# Altium footprint library Connector_Samtec_HLE_SMD.PcbLib: 290 footprints (part 21 of 24) (continued)
## Samtec_HLE-147-02-xxx-DV-BE-A_2x47_P2.54mm_Horizontal [mm] (continued)
  round 1.78 hole 1.78: Un37(-57.15,0) Un61(57.15,0)
F.SilkS:
  lines w0.12: -59.315,-2.65 -59.8,-2.65 -59.8,2.65 -59.315,2.65 -59.315,3.56 ; -57.525,-2.65 -56.775,-2.65 ; -57.525,2.65 -56.775,2.65 ; -54.985,-2.65 -54.235,-2.65 ; -54.985,2.65 -54.235,2.65 ; -52.445,-2.65 -51.695,-2.65 ; -52.445,2.65 -51.695,2.65 ; -49.905,-2.65 -49.155,-2.65 ; -49.905,2.65 -49.155,2.65 ; -47.365,-2.65 -46.615,-2.65 ; -47.365,2.65 -46.615,2.65 ; -44.825,-2.65 -44.075,-2.65 ; -44.825,2.65 -44.075,2.65 ; -42.285,-2.65 -41.535,-2.65 ; -42.285,2.65 -41.535,2.65 ; -39.745,-2.65 -38.995,-2.65 ; -39.745,2.65 -38.995,2.65 ; -37.205,-2.65 -36.455,-2.65 ; -37.205,2.65 -36.455,2.65 ; -34.665,-2.65 -33.915,-2.65 ; -34.665,2.65 -33.915,2.65 ; -32.125,-2.65 -31.375,-2.65 ; -32.125,2.65 -31.375,2.65 ; -29.585,-2.65 -28.835,-2.65 ; -29.585,2.65 -28.835,2.65 ; -27.045,-2.65 -26.295,-2.65 ; -27.045,2.65 -26.295,2.65 ; -24.505,-2.65 -23.755,-2.65 ; -24.505,2.65 -23.755,2.65 ; -21.965,-2.65 -21.215,-2.65 ; -21.965,2.65 -21.215,2.65 ; -19.425,-2.65 -18.675,-2.65 ; -19.425,2.65 -18.675,2.65 ; -16.885,-2.65 -16.135,-2.65 ; -16.885,2.65 -16.135,2.65 ; -14.345,-2.65 -13.595,-2.65 ; -14.345,2.65 -13.595,2.65 ; -11.805,-2.65 -11.055,-2.65 ; -11.805,2.65 -11.055,2.65 ; -9.265,-2.65 -8.515,-2.65 ; -9.265,2.65 -8.515,2.65 ; -6.725,-2.65 -5.975,-2.65 ; -6.725,2.65 -5.975,2.65 ; -4.185,-2.65 -3.435,-2.65 ; -4.185,2.65 -3.435,2.65 ; -1.645,-2.65 -0.895,-2.65 ; -1.645,2.65 -0.895,2.65 ; 0.895,-2.65 1.645,-2.65 ; 0.895,2.65 1.645,2.65 ; 3.435,-2.65 4.185,-2.65 ; 3.435,2.65 4.185,2.65 ; 5.975,-2.65 6.725,-2.65 ; 5.975,2.65 6.725,2.65 ; 8.515,-2.65 9.265,-2.65 ; 8.515,2.65 9.265,2.65 ; 11.055,-2.65 11.805,-2.65 ; 11.055,2.65 11.805,2.65 ; 13.595,-2.65 14.345,-2.65 ; 13.595,2.65 14.345,2.65 ; 16.135,-2.65 16.885,-2.65 ; 16.135,2.65 16.885,2.65 ; 18.675,-2.65 19.425,-2.65 ; 18.675,2.65 19.425,2.65 ; 21.215,-2.65 21.965,-2.65 ; 21.215,2.65 21.965,2.65 ; 23.755,-2.65 24.505,-2.65 ; 23.755,2.65 24.505,2.65 ; 26.295,-2.65 27.045,-2.65 ; 26.295,2.65 27.045,2.65 ; 28.835,-2.65 29.585,-2.65 ; 28.835,2.65 29.585,2.65 ; 31.375,-2.65 32.125,-2.65 ; 31.375,2.65 32.125,2.65 ; 33.915,-2.65 34.665,-2.65 ; 33.915,2.65 34.665,2.65 ; 36.455,-2.65 37.205,-2.65 ; 36.455,2.65 37.205,2.65 ; 38.995,-2.65 39.745,-2.65 ; 38.995,2.65 39.745,2.65 ; 41.535,-2.65 42.285,-2.65 ; 41.535,2.65 42.285,2.65 ; 44.075,-2.65 44.825,-2.65 ; 44.075,2.65 44.825,2.65 ; 46.615,-2.65 47.365,-2.65 ; 46.615,2.65 47.365,2.65 ; 49.155,-2.65 49.905,-2.65 ; 49.155,2.65 49.905,2.65 ; 51.695,-2.65 52.445,-2.65 ; 51.695,2.65 52.445,2.65 ; 54.235,-2.65 54.985,-2.65 ; 54.235,2.65 54.985,2.65 ; 56.775,-2.65 57.525,-2.65 ; 56.775,2.65 57.525,2.65 ; 59.315,-2.65 59.8,-2.65 59.8,2.65 59.315,2.65
F.CrtYd:
  lines w0.05: -60.19,-4.06 60.19,-4.06 60.19,4.06 -60.19,4.06 -60.19,-4.06
F.Fab:
  lines w0.1: -58.92,2.54 -58.42,1.833 -57.92,2.54 ; -59.69,-2.54 -59.69,2.54 59.69,2.54 59.69,-2.54 -59.69,-2.54
  text "'.Designator'" at -4.047,-2.68 h1

## Samtec_HLE-147-02-xxx-DV-BE-LC_2x47_P2.54mm_Horizontal [mm]
pads (190):
  rect 1.27x1.68 smd: 1(-58.42,2.72) 2(-58.42,-2.72) 3(-55.88,2.72) 4(-55.88,-2.72) 5(-53.34,2.72) 6(-53.34,-2.72) 7(-50.8,2.72) 8(-50.8,-2.72) 9(-48.26,2.72) 10(-48.26,-2.72) 11(-45.72,2.72) 12(-45.72,-2.72) 13(-43.18,2.72) 14(-43.18,-2.72) 15(-40.64,2.72) 16(-40.64,-2.72) 17(-38.1,2.72) 18(-38.1,-2.72) 19(-35.56,2.72) 20(-35.56,-2.72) 21(-33.02,2.72) 22(-33.02,-2.72) 23(-30.48,2.72) 24(-30.48,-2.72) 25(-27.94,2.72) 26(-27.94,-2.72) 27(-25.4,2.72) 28(-25.4,-2.72) 29(-22.86,2.72) 30(-22.86,-2.72) 31(-20.32,2.72) 32(-20.32,-2.72) 33(-17.78,2.72) 34(-17.78,-2.72) 35(-15.24,2.72) 36(-15.24,-2.72) 37(-12.7,2.72) 38(-12.7,-2.72) 39(-10.16,2.72) 40(-10.16,-2.72) 41(-7.62,2.72) 42(-7.62,-2.72) 43(-5.08,2.72) 44(-5.08,-2.72) 45(-2.54,2.72) 46(-2.54,-2.72) 47(0,2.72) 48(0,-2.72) 49(2.54,2.72) 50(2.54,-2.72) 51(5.08,2.72) 52(5.08,-2.72) 53(7.62,2.72) 54(7.62,-2.72) 55(10.16,2.72) 56(10.16,-2.72) 57(12.7,2.72) 58(12.7,-2.72) 59(15.24,2.72) 60(15.24,-2.72) 61(17.78,2.72) 62(17.78,-2.72) 63(20.32,2.72) 64(20.32,-2.72) 65(22.86,2.72) 66(22.86,-2.72) 67(25.4,2.72) 68(25.4,-2.72) 69(27.94,2.72) 70(27.94,-2.72) 71(30.48,2.72) 72(30.48,-2.72) 73(33.02,2.72) 74(33.02,-2.72) 75(35.56,2.72) 76(35.56,-2.72) 77(38.1,2.72) 78(38.1,-2.72) 79(40.64,2.72) 80(40.64,-2.72) 81(43.18,2.72) 82(43.18,-2.72) 83(45.72,2.72) 84(45.72,-2.72) 85(48.26,2.72) 86(48.26,-2.72) 87(50.8,2.72) 88(50.8,-2.72) 89(53.34,2.72) 90(53.34,-2.72) 91(55.88,2.72) 92(55.88,-2.72) 93(58.42,2.72) 94(58.42,-2.72)
  round 0.97 hole 0.97: Un1(-45.72,1.27) Un2(5.08,-1.27) Un3(48.26,-1.27) Un4(-7.62,1.27) Un5(-40.64,-1.27) Un6(-10.16,1.27) Un7(-2.54,1.27) Un8(25.4,-1.27) Un9(-53.34,-1.27) Un10(-10.16,-1.27) Un11(-48.26,1.27) Un12(-20.32,1.27) Un13(-25.4,1.27) Un14(53.34,-1.27) Un15(12.7,1.27) Un16(-45.72,-1.27) Un17(30.48,-1.27) Un18(-15.24,-1.27) Un19(25.4,1.27) Un20(-58.42,1.27) Un21(-12.7,-1.27) Un22(58.42,1.27) Un23(20.32,-1.27) Un24(-12.7,1.27) Un25(-5.08,1.27) Un26(0,-1.27) Un27(-20.32,-1.27) Un28(38.1,-1.27) Un29(-35.56,1.27) Un30(17.78,1.27) Un31(10.16,-1.27) Un32(15.24,-1.27) Un33(-43.18,1.27) Un34(17.78,-1.27) Un35(-17.78,1.27) Un36(50.8,-1.27) Un37(15.24,1.27) Un38(-40.64,1.27) Un39(-27.94,-1.27) Un40(55.88,1.27) Un41(30.48,1.27) Un42(-50.8,1.27) Un43(-50.8,-1.27) Un44(35.56,-1.27) Un45(-25.4,-1.27) Un46(-38.1,-1.27) Un47(-17.78,-1.27) Un48(-30.48,-1.27) Un49(-33.02,1.27) Un50(53.34,1.27) Un51(58.42,-1.27) Un52(-48.26,-1.27) Un53(2.54,1.27) Un54(20.32,1.27) Un55(10.16,1.27) Un56(12.7,-1.27) Un57(-30.48,1.27) Un58(55.88,-1.27) Un59(-22.86,-1.27) Un60(33.02,-1.27) Un62(38.1,1.27) Un63(-2.54,-1.27) Un64(-5.08,-1.27) Un65(33.02,1.27) Un66(22.86,1.27) Un67(45.72,-1.27) Un68(-58.42,-1.27) Un69(-55.88,-1.27) Un70(-33.02,-1.27) Un71(-35.56,-1.27) Un72(-55.88,1.27) Un73(5.08,1.27) Un74(7.62,1.27) Un75(50.8,1.27) Un76(27.94,-1.27) Un77(22.86,-1.27) Un78(40.64,-1.27) Un79(-53.34,1.27) Un80(43.18,1.27) Un81(-38.1,1.27) Un82(27.94,1.27) Un83(-15.24,1.27) Un84(-7.62,-1.27) Un85(45.72,1.27) Un86(35.56,1.27) Un87(-43.18,-1.27) Un88(-27.94,1.27) Un89(0,1.27) Un90(40.64,1.27) Un91(2.54,-1.27) Un93(48.26,1.27) Un94(-22.86,1.27) Un95(43.18,-1.27) Un96(7.62,-1.27)
  round 1.19 hole 1.19: Un61(57.15,0) Un92(-57.15,0)
F.SilkS:
  lines w0.12: -59.315,-2.65 -59.8,-2.65 -59.8,2.65 -59.315,2.65 -59.315,3.56 ; -57.525,-2.65 -56.775,-2.65 ; -57.525,2.65 -56.775,2.65 ; -54.985,-2.65 -54.235,-2.65 ; -54.985,2.65 -54.235,2.65 ; -52.445,-2.65 -51.695,-2.65 ; -52.445,2.65 -51.695,2.65 ; -49.905,-2.65 -49.155,-2.65 ; -49.905,2.65 -49.155,2.65 ; -47.365,-2.65 -46.615,-2.65 ; -47.365,2.65 -46.615,2.65 ; -44.825,-2.65 -44.075,-2.65 ; -44.825,2.65 -44.075,2.65 ; -42.285,-2.65 -41.535,-2.65 ; -42.285,2.65 -41.535,2.65 ; -39.745,-2.65 -38.995,-2.65 ; -39.745,2.65 -38.995,2.65 ; -37.205,-2.65 -36.455,-2.65 ; -37.205,2.65 -36.455,2.65 ; -34.665,-2.65 -33.915,-2.65 ; -34.665,2.65 -33.915,2.65 ; -32.125,-2.65 -31.375,-2.65 ; -32.125,2.65 -31.375,2.65 ; -29.585,-2.65 -28.835,-2.65 ; -29.585,2.65 -28.835,2.65 ; -27.045,-2.65 -26.295,-2.65 ; -27.045,2.65 -26.295,2.65 ; -24.505,-2.65 -23.755,-2.65 ; -24.505,2.65 -23.755,2.65 ; -21.965,-2.65 -21.215,-2.65 ; -21.965,2.65 -21.215,2.65 ; -19.425,-2.65 -18.675,-2.65 ; -19.425,2.65 -18.675,2.65 ; -16.885,-2.65 -16.135,-2.65 ; -16.885,2.65 -16.135,2.65 ; -14.345,-2.65 -13.595,-2.65 ; -14.345,2.65 -13.595,2.65 ; -11.805,-2.65 -11.055,-2.65 ; -11.805,2.65 -11.055,2.65 ; -9.265,-2.65 -8.515,-2.65 ; -9.265,2.65 -8.515,2.65 ; -6.725,-2.65 -5.975,-2.65 ; -6.725,2.65 -5.975,2.65 ; -4.185,-2.65 -3.435,-2.65 ; -4.185,2.65 -3.435,2.65 ; -1.645,-2.65 -0.895,-2.65 ; -1.645,2.65 -0.895,2.65 ; 0.895,-2.65 1.645,-2.65 ; 0.895,2.65 1.645,2.65 ; 3.435,-2.65 4.185,-2.65 ; 3.435,2.65 4.185,2.65 ; 5.975,-2.65 6.725,-2.65 ; 5.975,2.65 6.725,2.65 ; 8.515,-2.65 9.265,-2.65 ; 8.515,2.65 9.265,2.65 ; 11.055,-2.65 11.805,-2.65 ; 11.055,2.65 11.805,2.65 ; 13.595,-2.65 14.345,-2.65 ; 13.595,2.65 14.345,2.65 ; 16.135,-2.65 16.885,-2.65 ; 16.135,2.65 16.885,2.65 ; 18.675,-2.65 19.425,-2.65 ; 18.675,2.65 19.425,2.65 ; 21.215,-2.65 21.965,-2.65 ; 21.215,2.65 21.965,2.65 ; 23.755,-2.65 24.505,-2.65 ; 23.755,2.65 24.505,2.65 ; 26.295,-2.65 27.045,-2.65 ; 26.295,2.65 27.045,2.65 ; 28.835,-2.65 29.585,-2.65 ; 28.835,2.65 29.585,2.65 ; 31.375,-2.65 32.125,-2.65 ; 31.375,2.65 32.125,2.65 ; 33.915,-2.65 34.665,-2.65 ; 33.915,2.65 34.665,2.65 ; 36.455,-2.65 37.205,-2.65 ; 36.455,2.65 37.205,2.65 ; 38.995,-2.65 39.745,-2.65 ; 38.995,2.65 39.745,2.65 ; 41.535,-2.65 42.285,-2.65 ; 41.535,2.65 42.285,2.65 ; 44.075,-2.65 44.825,-2.65 ; 44.075,2.65 44.825,2.65 ; 46.615,-2.65 47.365,-2.65 ; 46.615,2.65 47.365,2.65 ; 49.155,-2.65 49.905,-2.65 ; 49.155,2.65 49.905,2.65 ; 51.695,-2.65 52.445,-2.65 ; 51.695,2.65 52.445,2.65 ; 54.235,-2.65 54.985,-2.65 ; 54.235,2.65 54.985,2.65 ; 56.775,-2.65 57.525,-2.65 ; 56.775,2.65 57.525,2.65 ; 59.315,-2.65 59.8,-2.65 59.8,2.65 59.315,2.65
F.CrtYd:
  lines w0.05: -60.19,-4.06 60.19,-4.06 60.19,4.06 -60.19,4.06 -60.19,-4.06
F.Fab:
  lines w0.1: -58.92,2.54 -58.42,1.833 -57.92,2.54 ; -59.69,-2.54 59.69,-2.54 59.69,2.54 -59.69,2.54 -59.69,-2.54
  text "'.Designator'" at -4.047,-2.68 h1

## Samtec_HLE-147-02-xxx-DV-BE_2x47_P2.54mm_Horizontal [mm]
pads (188):
  rect 1.27x1.68 smd: 1(-58.42,2.72) 2(-58.42,-2.72) 3(-55.88,2.72) 4(-55.88,-2.72) 5(-53.34,2.72) 6(-53.34,-2.72) 7(-50.8,2.72) 8(-50.8,-2.72) 9(-48.26,2.72) 10(-48.26,-2.72) 11(-45.72,2.72) 12(-45.72,-2.72) 13(-43.18,2.72) 14(-43.18,-2.72) 15(-40.64,2.72) 16(-40.64,-2.72) 17(-38.1,2.72) 18(-38.1,-2.72) 19(-35.56,2.72) 20(-35.56,-2.72) 21(-33.02,2.72) 22(-33.02,-2.72) 23(-30.48,2.72) 24(-30.48,-2.72) 25(-27.94,2.72) 26(-27.94,-2.72) 27(-25.4,2.72) 28(-25.4,-2.72) 29(-22.86,2.72) 30(-22.86,-2.72) 31(-20.32,2.72) 32(-20.32,-2.72) 33(-17.78,2.72) 34(-17.78,-2.72) 35(-15.24,2.72) 36(-15.24,-2.72) 37(-12.7,2.72) 38(-12.7,-2.72) 39(-10.16,2.72) 40(-10.16,-2.72) 41(-7.62,2.72) 42(-7.62,-2.72) 43(-5.08,2.72) 44(-5.08,-2.72) 45(-2.54,2.72) 46(-2.54,-2.72) 47(0,2.72) 48(0,-2.72) 49(2.54,2.72) 50(2.54,-2.72) 51(5.08,2.72) 52(5.08,-2.72) 53(7.62,2.72) 54(7.62,-2.72) 55(10.16,2.72) 56(10.16,-2.72) 57(12.7,2.72) 58(12.7,-2.72) 59(15.24,2.72) 60(15.24,-2.72) 61(17.78,2.72) 62(17.78,-2.72) 63(20.32,2.72) 64(20.32,-2.72) 65(22.86,2.72) 66(22.86,-2.72) 67(25.4,2.72) 68(25.4,-2.72) 69(27.94,2.72) 70(27.94,-2.72) 71(30.48,2.72) 72(30.48,-2.72) 73(33.02,2.72) 74(33.02,-2.72) 75(35.56,2.72) 76(35.56,-2.72) 77(38.1,2.72) 78(38.1,-2.72) 79(40.64,2.72) 80(40.64,-2.72) 81(43.18,2.72) 82(43.18,-2.72) 83(45.72,2.72) 84(45.72,-2.72) 85(48.26,2.72) 86(48.26,-2.72) 87(50.8,2.72) 88(50.8,-2.72) 89(53.34,2.72) 90(53.34,-2.72) 91(55.88,2.72) 92(55.88,-2.72) 93(58.42,2.72) 94(58.42,-2.72)
  round 0.97 hole 0.97: Un1(-43.18,1.27) Un2(17.78,-1.27) Un3(38.1,-1.27) Un4(53.34,1.27) Un5(-30.48,-1.27) Un6(48.26,-1.27) Un7(12.7,-1.27) Un8(-40.64,1.27) Un9(2.54,-1.27) Un10(35.56,1.27) Un11(-17.78,-1.27) Un12(-33.02,1.27) Un13(-12.7,1.27) Un14(-17.78,1.27) Un15(45.72,-1.27) Un16(55.88,1.27) Un17(0,-1.27) Un18(-7.62,-1.27) Un19(-20.32,1.27) Un20(0,1.27) Un21(40.64,-1.27) Un22(38.1,1.27) Un23(-58.42,-1.27) Un24(27.94,-1.27) Un25(-30.48,1.27) Un26(-33.02,-1.27) Un27(-53.34,1.27) Un28(-55.88,1.27) Un29(5.08,1.27) Un30(-25.4,-1.27) Un31(27.94,1.27) Un32(40.64,1.27) Un33(-35.56,-1.27) Un34(-10.16,-1.27) Un35(20.32,-1.27) Un36(-7.62,1.27) Un37(-22.86,1.27) Un38(-25.4,1.27) Un39(58.42,1.27) Un40(43.18,1.27) Un41(25.4,-1.27) Un42(-12.7,-1.27) Un43(5.08,-1.27) Un44(55.88,-1.27) Un45(50.8,1.27) Un46(15.24,1.27) Un47(-43.18,-1.27) Un48(-35.56,1.27) Un49(-55.88,-1.27) Un50(-27.94,1.27) Un51(-38.1,1.27) Un52(-22.86,-1.27) Un53(12.7,1.27) Un54(45.72,1.27) Un55(-48.26,-1.27) Un56(-20.32,-1.27) Un57(33.02,-1.27) Un58(-58.42,1.27) Un59(50.8,-1.27) Un60(-2.54,-1.27) Un61(53.34,-1.27) Un62(48.26,1.27) Un63(30.48,-1.27) Un64(43.18,-1.27) Un65(-5.08,1.27) Un66(10.16,-1.27) Un67(22.86,-1.27) Un68(-2.54,1.27) Un69(-53.34,-1.27) Un70(-38.1,-1.27) Un71(10.16,1.27) Un72(58.42,-1.27) Un73(-50.8,-1.27) Un74(35.56,-1.27) Un75(-15.24,1.27) Un76(-10.16,1.27) Un77(-27.94,-1.27) Un78(7.62,1.27) Un79(22.86,1.27) Un80(30.48,1.27) Un81(-15.24,-1.27) Un82(15.24,-1.27) Un83(-5.08,-1.27) Un84(20.32,1.27) Un85(-45.72,-1.27) Un86(33.02,1.27) Un87(25.4,1.27) Un88(2.54,1.27) Un89(-50.8,1.27) Un90(-40.64,-1.27) Un91(7.62,-1.27) Un92(-45.72,1.27) Un93(-48.26,1.27) Un94(17.78,1.27)
F.SilkS:
  lines w0.12: -59.315,-2.65 -59.8,-2.65 -59.8,2.65 -59.315,2.65 -59.315,3.56 ; -57.525,-2.65 -56.775,-2.65 ; -57.525,2.65 -56.775,2.65 ; -54.985,-2.65 -54.235,-2.65 ; -54.985,2.65 -54.235,2.65 ; -52.445,-2.65 -51.695,-2.65 ; -52.445,2.65 -51.695,2.65 ; -49.905,-2.65 -49.155,-2.65 ; -49.905,2.65 -49.155,2.65 ; -47.365,-2.65 -46.615,-2.65 ; -47.365,2.65 -46.615,2.65 ; -44.825,-2.65 -44.075,-2.65 ; -44.825,2.65 -44.075,2.65 ; -42.285,-2.65 -41.535,-2.65 ; -42.285,2.65 -41.535,2.65 ; -39.745,-2.65 -38.995,-2.65 ; -39.745,2.65 -38.995,2.65 ; -37.205,-2.65 -36.455,-2.65 ; -37.205,2.65 -36.455,2.65 ; -34.665,-2.65 -33.915,-2.65 ; -34.665,2.65 -33.915,2.65 ; -32.125,-2.65 -31.375,-2.65 ; -32.125,2.65 -31.375,2.65 ; -29.585,-2.65 -28.835,-2.65 ; -29.585,2.65 -28.835,2.65 ; -27.045,-2.65 -26.295,-2.65 ; -27.045,2.65 -26.295,2.65 ; -24.505,-2.65 -23.755,-2.65 ; -24.505,2.65 -23.755,2.65 ; -21.965,-2.65 -21.215,-2.65 ; -21.965,2.65 -21.215,2.65 ; -19.425,-2.65 -18.675,-2.65 ; -19.425,2.65 -18.675,2.65 ; -16.885,-2.65 -16.135,-2.65 ; -16.885,2.65 -16.135,2.65 ; -14.345,-2.65 -13.595,-2.65 ; -14.345,2.65 -13.595,2.65 ; -11.805,-2.65 -11.055,-2.65 ; -11.805,2.65 -11.055,2.65 ; -9.265,-2.65 -8.515,-2.65 ; -9.265,2.65 -8.515,2.65 ; -6.725,-2.65 -5.975,-2.65 ; -6.725,2.65 -5.975,2.65 ; -4.185,-2.65 -3.435,-2.65 ; -4.185,2.65 -3.435,2.65 ; -1.645,-2.65 -0.895,-2.65 ; -1.645,2.65 -0.895,2.65 ; 0.895,-2.65 1.645,-2.65 ; 0.895,2.65 1.645,2.65 ; 3.435,-2.65 4.185,-2.65 ; 3.435,2.65 4.185,2.65 ; 5.975,-2.65 6.725,-2.65 ; 5.975,2.65 6.725,2.65 ; 8.515,-2.65 9.265,-2.65 ; 8.515,2.65 9.265,2.65 ; 11.055,-2.65 11.805,-2.65 ; 11.055,2.65 11.805,2.65 ; 13.595,-2.65 14.345,-2.65 ; 13.595,2.65 14.345,2.65 ; 16.135,-2.65 16.885,-2.65 ; 16.135,2.65 16.885,2.65 ; 18.675,-2.65 19.425,-2.65 ; 18.675,2.65 19.425,2.65 ; 21.215,-2.65 21.965,-2.65 ; 21.215,2.65 21.965,2.65 ; 23.755,-2.65 24.505,-2.65 ; 23.755,2.65 24.505,2.65 ; 26.295,-2.65 27.045,-2.65 ; 26.295,2.65 27.045,2.65 ; 28.835,-2.65 29.585,-2.65 ; 28.835,2.65 29.585,2.65 ; 31.375,-2.65 32.125,-2.65 ; 31.375,2.65 32.125,2.65 ; 33.915,-2.65 34.665,-2.65 ; 33.915,2.65 34.665,2.65 ; 36.455,-2.65 37.205,-2.65 ; 36.455,2.65 37.205,2.65 ; 38.995,-2.65 39.745,-2.65 ; 38.995,2.65 39.745,2.65 ; 41.535,-2.65 42.285,-2.65 ; 41.535,2.65 42.285,2.65 ; 44.075,-2.65 44.825,-2.65 ; 44.075,2.65 44.825,2.65 ; 46.615,-2.65 47.365,-2.65 ; 46.615,2.65 47.365,2.65 ; 49.155,-2.65 49.905,-2.65 ; 49.155,2.65 49.905,2.65 ; 51.695,-2.65 52.445,-2.65 ; 51.695,2.65 52.445,2.65 ; 54.235,-2.65 54.985,-2.65 ; 54.235,2.65 54.985,2.65 ; 56.775,-2.65 57.525,-2.65 ; 56.775,2.65 57.525,2.65 ; 59.315,-2.65 59.8,-2.65 59.8,2.65 59.315,2.65
F.CrtYd:
  lines w0.05: -60.19,-4.06 60.19,-4.06 60.19,4.06 -60.19,4.06 -60.19,-4.06
F.Fab:
  lines w0.1: -58.92,2.54 -58.42,1.833 -57.92,2.54 ; -59.69,-2.54 59.69,-2.54 59.69,2.54 -59.69,2.54 -59.69,-2.54
  text "'.Designator'" at -4.047,-2.68 h1

## Samtec_HLE-147-02-xxx-DV-LC_2x47_P2.54mm_Horizontal [mm]
pads (96):
  rect 1.27x2.29 smd: 1(-58.42,2.525) 2(-58.42,-2.525) 3(-55.88,2.525) 4(-55.88,-2.525) 5(-53.34,2.525) 6(-53.34,-2.525) 7(-50.8,2.525) 8(-50.8,-2.525) 9(-48.26,2.525) 10(-48.26,-2.525) 11(-45.72,2.525) 12(-45.72,-2.525) 13(-43.18,2.525) 14(-43.18,-2.525) 15(-40.64,2.525) 16(-40.64,-2.525) 17(-38.1,2.525) 18(-38.1,-2.525) 19(-35.56,2.525) 20(-35.56,-2.525) 21(-33.02,2.525) 22(-33.02,-2.525) 23(-30.48,2.525) 24(-30.48,-2.525) 25(-27.94,2.525) 26(-27.94,-2.525) 27(-25.4,2.525) 28(-25.4,-2.525) 29(-22.86,2.525) 30(-22.86,-2.525) 31(-20.32,2.525) 32(-20.32,-2.525) 33(-17.78,2.525) 34(-17.78,-2.525) 35(-15.24,2.525) 36(-15.24,-2.525) 37(-12.7,2.525) 38(-12.7,-2.525) 39(-10.16,2.525) 40(-10.16,-2.525) 41(-7.62,2.525) 42(-7.62,-2.525) 43(-5.08,2.525) 44(-5.08,-2.525) 45(-2.54,2.525) 46(-2.54,-2.525) 47(0,2.525) 48(0,-2.525) 49(2.54,2.525) 50(2.54,-2.525) 51(5.08,2.525) 52(5.08,-2.525) 53(7.62,2.525) 54(7.62,-2.525) 55(10.16,2.525) 56(10.16,-2.525) 57(12.7,2.525) 58(12.7,-2.525) 59(15.24,2.525) 60(15.24,-2.525) 61(17.78,2.525) 62(17.78,-2.525) 63(20.32,2.525) 64(20.32,-2.525) 65(22.86,2.525) 66(22.86,-2.525) 67(25.4,2.525) 68(25.4,-2.525) 69(27.94,2.525) 70(27.94,-2.525) 71(30.48,2.525) 72(30.48,-2.525) 73(33.02,2.525) 74(33.02,-2.525) 75(35.56,2.525) 76(35.56,-2.525) 77(38.1,2.525) 78(38.1,-2.525) 79(40.64,2.525) 80(40.64,-2.525) 81(43.18,2.525) 82(43.18,-2.525) 83(45.72,2.525) 84(45.72,-2.525) 85(48.26,2.525) 86(48.26,-2.525) 87(50.8,2.525) 88(50.8,-2.525) 89(53.34,2.525) 90(53.34,-2.525) 91(55.88,2.525) 92(55.88,-2.525) 93(58.42,2.525) 94(58.42,-2.525)
  round 1.19 hole 1.19: Un1(-57.15,0) Un2(57.15,0)
F.SilkS:
  lines w0.12: -59.315,-2.65 -59.8,-2.65 -59.8,2.65 -59.315,2.65 -59.315,3.67 ; -57.525,-2.65 -56.775,-2.65 ; -57.525,2.65 -56.775,2.65 ; -54.985,-2.65 -54.235,-2.65 ; -54.985,2.65 -54.235,2.65 ; -52.445,-2.65 -51.695,-2.65 ; -52.445,2.65 -51.695,2.65 ; -49.905,-2.65 -49.155,-2.65 ; -49.905,2.65 -49.155,2.65 ; -47.365,-2.65 -46.615,-2.65 ; -47.365,2.65 -46.615,2.65 ; -44.825,-2.65 -44.075,-2.65 ; -44.825,2.65 -44.075,2.65 ; -42.285,-2.65 -41.535,-2.65 ; -42.285,2.65 -41.535,2.65 ; -39.745,-2.65 -38.995,-2.65 ; -39.745,2.65 -38.995,2.65 ; -37.205,-2.65 -36.455,-2.65 ; -37.205,2.65 -36.455,2.65 ; -34.665,-2.65 -33.915,-2.65 ; -34.665,2.65 -33.915,2.65 ; -32.125,-2.65 -31.375,-2.65 ; -32.125,2.65 -31.375,2.65 ; -29.585,-2.65 -28.835,-2.65 ; -29.585,2.65 -28.835,2.65 ; -27.045,-2.65 -26.295,-2.65 ; -27.045,2.65 -26.295,2.65 ; -24.505,-2.65 -23.755,-2.65 ; -24.505,2.65 -23.755,2.65 ; -21.965,-2.65 -21.215,-2.65 ; -21.965,2.65 -21.215,2.65 ; -19.425,-2.65 -18.675,-2.65 ; -19.425,2.65 -18.675,2.65 ; -16.885,-2.65 -16.135,-2.65 ; -16.885,2.65 -16.135,2.65 ; -14.345,-2.65 -13.595,-2.65 ; -14.345,2.65 -13.595,2.65 ; -11.805,-2.65 -11.055,-2.65 ; -11.805,2.65 -11.055,2.65 ; -9.265,-2.65 -8.515,-2.65 ; -9.265,2.65 -8.515,2.65 ; -6.725,-2.65 -5.975,-2.65 ; -6.725,2.65 -5.975,2.65 ; -4.185,-2.65 -3.435,-2.65 ; -4.185,2.65 -3.435,2.65 ; -1.645,-2.65 -0.895,-2.65 ; -1.645,2.65 -0.895,2.65 ; 0.895,-2.65 1.645,-2.65 ; 0.895,2.65 1.645,2.65 ; 3.435,-2.65 4.185,-2.65 ; 3.435,2.65 4.185,2.65 ; 5.975,-2.65 6.725,-2.65 ; 5.975,2.65 6.725,2.65 ; 8.515,-2.65 9.265,-2.65 ; 8.515,2.65 9.265,2.65 ; 11.055,-2.65 11.805,-2.65 ; 11.055,2.65 11.805,2.65 ; 13.595,-2.65 14.345,-2.65 ; 13.595,2.65 14.345,2.65 ; 16.135,-2.65 16.885,-2.65 ; 16.135,2.65 16.885,2.65 ; 18.675,-2.65 19.425,-2.65 ; 18.675,2.65 19.425,2.65 ; 21.215,-2.65 21.965,-2.65 ; 21.215,2.65 21.965,2.65 ; 23.755,-2.65 24.505,-2.65 ; 23.755,2.65 24.505,2.65 ; 26.295,-2.65 27.045,-2.65 ; 26.295,2.65 27.045,2.65 ; 28.835,-2.65 29.585,-2.65 ; 28.835,2.65 29.585,2.65 ; 31.375,-2.65 32.125,-2.65 ; 31.375,2.65 32.125,2.65 ; 33.915,-2.65 34.665,-2.65 ; 33.915,2.65 34.665,2.65 ; 36.455,-2.65 37.205,-2.65 ; 36.455,2.65 37.205,2.65 ; 38.995,-2.65 39.745,-2.65 ; 38.995,2.65 39.745,2.65 ; 41.535,-2.65 42.285,-2.65 ; 41.535,2.65 42.285,2.65 ; 44.075,-2.65 44.825,-2.65 ; 44.075,2.65 44.825,2.65 ; 46.615,-2.65 47.365,-2.65 ; 46.615,2.65 47.365,2.65 ; 49.155,-2.65 49.905,-2.65 ; 49.155,2.65 49.905,2.65 ; 51.695,-2.65 52.445,-2.65 ; 51.695,2.65 52.445,2.65 ; 54.235,-2.65 54.985,-2.65 ; 54.235,2.65 54.985,2.65 ; 56.775,-2.65 57.525,-2.65 ; 56.775,2.65 57.525,2.65 ; 59.315,-2.65 59.8,-2.65 59.8,2.65 59.315,2.65
F.CrtYd:
  lines w0.05: -60.19,-4.17 -60.19,4.17 60.19,4.17 60.19,-4.17 -60.19,-4.17
F.Fab:
  lines w0.1: -58.92,2.54 -58.42,1.833 -57.92,2.54 ; -59.69,-2.54 -59.69,2.54 59.69,2.54 59.69,-2.54 -59.69,-2.54
  text "'.Designator'" at -4.047,-2.68 h1

## Samtec_HLE-147-02-xxx-DV_2x47_P2.54mm_Horizontal [mm]
pads (94):
  rect 1.27x2.29 smd: 1(-58.42,2.525) 2(-58.42,-2.525) 3(-55.88,2.525) 4(-55.88,-2.525) 5(-53.34,2.525) 6(-53.34,-2.525) 7(-50.8,2.525) 8(-50.8,-2.525) 9(-48.26,2.525) 10(-48.26,-2.525) 11(-45.72,2.525) 12(-45.72,-2.525) 13(-43.18,2.525) 14(-43.18,-2.525) 15(-40.64,2.525) 16(-40.64,-2.525) 17(-38.1,2.525) 18(-38.1,-2.525) 19(-35.56,2.525) 20(-35.56,-2.525) 21(-33.02,2.525) 22(-33.02,-2.525) 23(-30.48,2.525) 24(-30.48,-2.525) 25(-27.94,2.525) 26(-27.94,-2.525) 27(-25.4,2.525) 28(-25.4,-2.525) 29(-22.86,2.525) 30(-22.86,-2.525) 31(-20.32,2.525) 32(-20.32,-2.525) 33(-17.78,2.525) 34(-17.78,-2.525) 35(-15.24,2.525) 36(-15.24,-2.525) 37(-12.7,2.525) 38(-12.7,-2.525) 39(-10.16,2.525) 40(-10.16,-2.525) 41(-7.62,2.525) 42(-7.62,-2.525) 43(-5.08,2.525) 44(-5.08,-2.525) 45(-2.54,2.525) 46(-2.54,-2.525) 47(0,2.525) 48(0,-2.525) 49(2.54,2.525) 50(2.54,-2.525) 51(5.08,2.525) 52(5.08,-2.525) 53(7.62,2.525) 54(7.62,-2.525) 55(10.16,2.525) 56(10.16,-2.525) 57(12.7,2.525) 58(12.7,-2.525) 59(15.24,2.525) 60(15.24,-2.525) 61(17.78,2.525) 62(17.78,-2.525) 63(20.32,2.525) 64(20.32,-2.525) 65(22.86,2.525) 66(22.86,-2.525) 67(25.4,2.525) 68(25.4,-2.525) 69(27.94,2.525) 70(27.94,-2.525) 71(30.48,2.525) 72(30.48,-2.525) 73(33.02,2.525) 74(33.02,-2.525) 75(35.56,2.525) 76(35.56,-2.525) 77(38.1,2.525) 78(38.1,-2.525) 79(40.64,2.525) 80(40.64,-2.525) 81(43.18,2.525) 82(43.18,-2.525) 83(45.72,2.525) 84(45.72,-2.525) 85(48.26,2.525) 86(48.26,-2.525) 87(50.8,2.525) 88(50.8,-2.525) 89(53.34,2.525) 90(53.34,-2.525) 91(55.88,2.525) 92(55.88,-2.525) 93(58.42,2.525) 94(58.42,-2.525)
F.SilkS:
  lines w0.12: -59.315,-2.65 -59.8,-2.65 -59.8,2.65 -59.315,2.65 -59.315,3.67 ; -57.525,-2.65 -56.775,-2.65 ; -57.525,2.65 -56.775,2.65 ; -54.985,-2.65 -54.235,-2.65 ; -54.985,2.65 -54.235,2.65 ; -52.445,-2.65 -51.695,-2.65 ; -52.445,2.65 -51.695,2.65 ; -49.905,-2.65 -49.155,-2.65 ; -49.905,2.65 -49.155,2.65 ; -47.365,-2.65 -46.615,-2.65 ; -47.365,2.65 -46.615,2.65 ; -44.825,-2.65 -44.075,-2.65 ; -44.825,2.65 -44.075,2.65 ; -42.285,-2.65 -41.535,-2.65 ; -42.285,2.65 -41.535,2.65 ; -39.745,-2.65 -38.995,-2.65 ; -39.745,2.65 -38.995,2.65 ; -37.205,-2.65 -36.455,-2.65 ; -37.205,2.65 -36.455,2.65 ; -34.665,-2.65 -33.915,-2.65 ; -34.665,2.65 -33.915,2.65 ; -32.125,-2.65 -31.375,-2.65 ; -32.125,2.65 -31.375,2.65 ; -29.585,-2.65 -28.835,-2.65 ; -29.585,2.65 -28.835,2.65 ; -27.045,-2.65 -26.295,-2.65 ; -27.045,2.65 -26.295,2.65 ; -24.505,-2.65 -23.755,-2.65 ; -24.505,2.65 -23.755,2.65 ; -21.965,-2.65 -21.215,-2.65 ; -21.965,2.65 -21.215,2.65 ; -19.425,-2.65 -18.675,-2.65 ; -19.425,2.65 -18.675,2.65 ; -16.885,-2.65 -16.135,-2.65 ; -16.885,2.65 -16.135,2.65 ; -14.345,-2.65 -13.595,-2.65 ; -14.345,2.65 -13.595,2.65 ; -11.805,-2.65 -11.055,-2.65 ; -11.805,2.65 -11.055,2.65 ; -9.265,-2.65 -8.515,-2.65 ; -9.265,2.65 -8.515,2.65 ; -6.725,-2.65 -5.975,-2.65 ; -6.725,2.65 -5.975,2.65 ; -4.185,-2.65 -3.435,-2.65 ; -4.185,2.65 -3.435,2.65 ; -1.645,-2.65 -0.895,-2.65 ; -1.645,2.65 -0.895,2.65 ; 0.895,-2.65 1.645,-2.65 ; 0.895,2.65 1.645,2.65 ; 3.435,-2.65 4.185,-2.65 ; 3.435,2.65 4.185,2.65 ; 5.975,-2.65 6.725,-2.65 ; 5.975,2.65 6.725,2.65 ; 8.515,-2.65 9.265,-2.65 ; 8.515,2.65 9.265,2.65 ; 11.055,-2.65 11.805,-2.65 ; 11.055,2.65 11.805,2.65 ; 13.595,-2.65 14.345,-2.65 ; 13.595,2.65 14.345,2.65 ; 16.135,-2.65 16.885,-2.65 ; 16.135,2.65 16.885,2.65 ; 18.675,-2.65 19.425,-2.65 ; 18.675,2.65 19.425,2.65 ; 21.215,-2.65 21.965,-2.65 ; 21.215,2.65 21.965,2.65 ; 23.755,-2.65 24.505,-2.65 ; 23.755,2.65 24.505,2.65 ; 26.295,-2.65 27.045,-2.65 ; 26.295,2.65 27.045,2.65 ; 28.835,-2.65 29.585,-2.65 ; 28.835,2.65 29.585,2.65 ; 31.375,-2.65 32.125,-2.65 ; 31.375,2.65 32.125,2.65 ; 33.915,-2.65 34.665,-2.65 ; 33.915,2.65 34.665,2.65 ; 36.455,-2.65 37.205,-2.65 ; 36.455,2.65 37.205,2.65 ; 38.995,-2.65 39.745,-2.65 ; 38.995,2.65 39.745,2.65 ; 41.535,-2.65 42.285,-2.65 ; 41.535,2.65 42.285,2.65 ; 44.075,-2.65 44.825,-2.65 ; 44.075,2.65 44.825,2.65 ; 46.615,-2.65 47.365,-2.65 ; 46.615,2.65 47.365,2.65 ; 49.155,-2.65 49.905,-2.65 ; 49.155,2.65 49.905,2.65 ; 51.695,-2.65 52.445,-2.65 ; 51.695,2.65 52.445,2.65 ; 54.235,-2.65 54.985,-2.65 ; 54.235,2.65 54.985,2.65 ; 56.775,-2.65 57.525,-2.65 ; 56.775,2.65 57.525,2.65 ; 59.315,-2.65 59.8,-2.65 59.8,2.65 59.315,2.65
F.CrtYd:
  lines w0.05: -60.19,-4.17 60.19,-4.17 60.19,4.17 -60.19,4.17 -60.19,-4.17
F.Fab:
  lines w0.1: -58.92,2.54 -58.42,1.833 -57.92,2.54 ; -59.69,-2.54 59.69,-2.54 59.69,2.54 -59.69,2.54 -59.69,-2.54
  text "'.Designator'" at -4.047,-2.68 h1